# Altium footprint library PcbLib1.PcbLib: 56 footprints (part 3 of 4)
Each footprint in its own frame and in the unit in brackets; x right, y up, seen from the top. Pads: shape width x height; smd on the part's side, far side on the other; paste and mask are expansions set on the pad; w line width, h text height; cw(c..) or ccw(c..) is an arc to the next point about the centre after c.
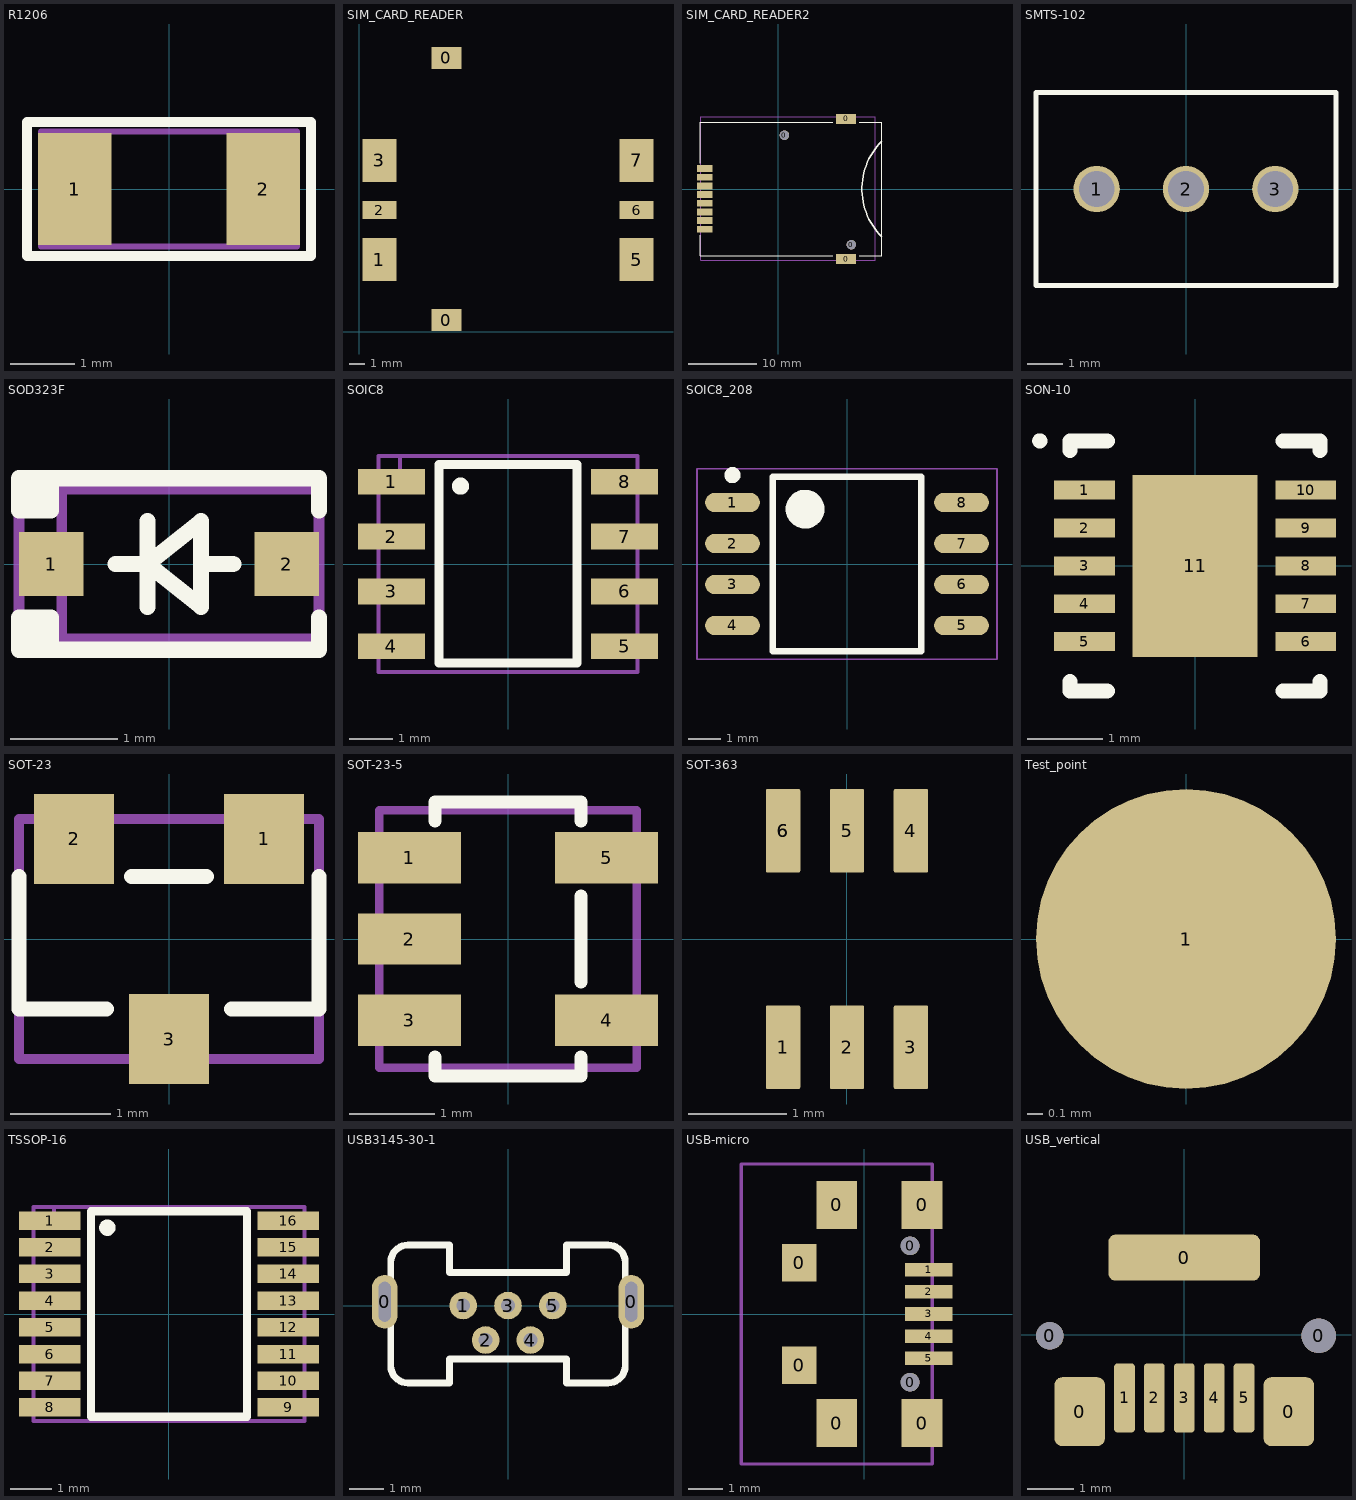
[diagram p2: the footprints below, top view; thin cyan lines are the x and y axes]

## R1206 [mm]
pads (2):
  rect 1.15x1.75 smd: 1(-1.475,0) 2(1.475,0)
Top Overlay:
  lines w0.15: -2.225,-1.05 -2.225,1.05 -1.375,1.05 2.225,1.05 2.225,-1.05 -2.225,-1.05
Mechanical 15:
  lines w0.1: -2,-0.9 2,-0.9 2,0.9 -2,0.9 -2,-0.9
  text ".Designator" at -1.7,-0.1 h0.5
3D body "RES1206-2.step": height 0.55, standoff 0, extent -1.505,-0.775 1.505,0.775

## SIM_CARD_READER [mm]
pads (8):
  rect 1.95x1.45 smd: 0(5.69,0.755) 0(5.69,17.885)
  rect 2.2x2.8 smd: 1(1.31,4.705) 3(1.31,11.185) 5(18.11,4.705) 7(18.11,11.185)
  rect 2.2x1.2 smd: 2(1.31,7.945) 6(18.11,7.945)
3D body "SIM1.stp": height 1.9, standoff -0.1, extent 0.2,0.25 25.72,18.35

## SIM_CARD_READER2 [mm]
pads (12):
  round 1.4 hole 1.4 unplated: 0(0.935,7.885) 0(10.735,-8.165)
  rect 2.95x1.5 smd: 0(9.965,-10.275) 0(9.965,10.275)
  rect 2.3x1 smd: 1(-10.735,2.985) 2(-10.735,1.715) 3(-10.735,0.445) 4(-10.735,-0.825) 5(-10.735,-2.095) 6(-10.735,-3.365) 7(-10.735,-4.635) 8(-10.735,-5.905)
Top Overlay:
  lines w0.15: -11.4,-6.8 -11.4,-9.8 8,-9.8 ; -11.4,3.8 -11.4,9.8 8,9.8 ; 11.9,-9.8 15.2,-9.8 15.2,9.8 11.9,9.8
  lines w0.2: 15.2,-7 cw(c22.2,0) 15.2,7
Mechanical 15:
  lines w0.1: -11.335,-10.415 14.265,-10.415 14.265,10.585 -11.335,10.585 -11.335,-10.415
  text ".Designator" at -0.935,-0.215 h0.5
3D body "SIM2.stp": height 1.94, standoff -0.56, extent -11.335,-10.39 15.165,10.56

## SMTS-102 [mm]
pads (3):
  round 1.3 hole 1 mask+0.07: 1(-2.5,0) 2(0,0) 3(2.5,0)
Top Overlay:
  lines w0.15: -4.2,-2.7 4.2,-2.7 4.2,2.7 -4.2,2.7 -4.2,-2.7
3D body: height 8.4, standoff 1.2, extent -3,-2.7 3,2.7
3D body: height 1.2, standoff -4.8, extent 2.25,-0.4 2.75,0.4
3D body: height 1.2, standoff -4.8, extent -2.75,-0.4 -2.25,0.4
3D body: height 1.2, standoff -4.8, extent -0.25,-0.4 0.25,0.4
3D body: height 22.9, standoff 13.29, extent -1.142,-1.25 4.965,1.25
3D body: height 14.3, standoff 8.3, extent -2.4,-2.4 2.4,2.4
3D body: height 8.3, standoff 1.2, extent -4.1,-2.6 4.1,2.6

## SOD323F [mm]
pads (2):
  rect 0.6x0.6 smd: 1(-1.1,0) 2(1.1,0)
Top Overlay:
  lines w0.15: -1.1,-0.8 -1.1,-0.5 -1.4,-0.5 -1.4,-0.8 1.4,-0.8 1.4,-0.5 ; -1.1,0.8 -1.1,0.5 -1.4,0.5 -1.4,0.8 1.4,0.8 1.4,0.5 ; -0.5,0 -0.2,0 ; -0.2,-0.4 -0.2,0.4 ; 0.3,0 0.6,0 ; -0.2,0 0.3,0.4 0.3,-0.4 -0.2,0 ; -1.3,-0.8 -1.3,-0.5 -1.2,-0.5 -1.2,-0.8 -1.3,-0.8 ; -1.3,0.5 -1.3,0.8 -1.2,0.8 -1.2,0.5 -1.3,0.5
Mechanical 15:
  lines w0.1: -1,-0.7 -1,0.7 ; -1.4,-0.7 1.4,-0.7 1.4,0.7 -1.4,0.7 -1.4,-0.7
  text ".Designator" at -1.7,-0.1 h0.5
3D body "SOD-323F.STEP": height 0.79, standoff -0.08, extent -1.35,-0.675 1.35,0.675

## SOIC8 [mm]
pads (8):
  rect 1.55x0.6 smd: 1(-2.7,1.905) 2(-2.7,0.635) 3(-2.7,-0.635) 4(-2.7,-1.905) 5(2.7,-1.905) 6(2.7,-0.635) 7(2.7,0.635) 8(2.7,1.905)
Top Layer:
  region: -2.7,1.905
Top Overlay:
  circle w0.2: c-1.1,1.805 r0.1
  lines w0.2: -1.6,-2.295 1.6,-2.295 1.6,2.305 -1.6,2.305 -1.6,-2.295
Mechanical 15:
  lines w0.1: -3,2 -2.5,2 -2.5,2.5 ; -3,-2.5 3,-2.5 3,2.5 -3,2.5 -3,-2.5
  text ".Designator" at -2.1,-0.195 h0.5
3D body "SOIC-8-1.step": height 1.75, standoff 0, extent -3,-2.45 3,2.45

## SOIC8_208 [mm]
height 2.16
pads (8):
  oval 1.7x0.6 smd: 1(-3.55,1.905) 2(-3.55,0.635) 3(-3.55,-0.635) 4(-3.55,-1.905) 5(3.55,-1.905) 6(3.55,-0.635) 7(3.55,0.635) 8(3.55,1.905)
Top Overlay:
  circle w0.6: c-1.3,1.7 r0.3
  circle w0.25: c-3.55,2.755 r0.125
  lines w0.2: -2.3,-2.7 2.3,-2.7 2.3,2.7 -2.3,2.7 -2.3,-2.7
Mechanical 15:
  lines w0.05: -4.65,-2.95 4.65,-2.95 4.65,2.95 -4.65,2.95 -4.65,-2.95
3D body "User Library-SOIC-8-208.STEP": height 2.1, standoff -0.05, extent -4.1,-2.7 4.1,2.7

## SON-10 [mm] "SON, 10-Leads, Body 3,00x3,00mm, Pitch 0,50mm, Thermal Pad 2,40x1,65mm, IPC Medium Density"
height 0.75
pads (11):
  rect 0.8x0.25 smd: 1(-1.46,1) 2(-1.46,0.5) 3(-1.46,0) 4(-1.46,-0.5) 5(-1.46,-1) 6(1.46,-1) 7(1.46,-0.5) 8(1.46,0) 9(1.46,0.5) 10(1.46,1)
  rect 1.65x2.4 smd: 11(0,0)
Top Overlay:
  circle w0.1: c-2.05,1.65 r0.05
  lines w0.2: -1.65,-1.525 -1.65,-1.65 -1.16,-1.65 ; -1.65,1.525 -1.65,1.65 -1.16,1.65 ; 1.16,-1.65 1.65,-1.65 1.65,-1.525 ; 1.16,1.65 1.65,1.65 1.65,1.525
3D body "SON10-3x3mm.step": height 0.87, standoff -0.03, extent -1.5,-1.5 1.5,1.5

## SOT-23 [mm]
pads (3):
  rect 0.8x0.9 smd: 1(0.95,1) 2(-0.95,1) 3(0,-1)
Top Overlay:
  lines w0.15: -1.5,0.625 -1.5,-0.7 -0.625,-0.7 ; -0.375,0.625 0.375,0.625 ; 0.625,-0.7 1.5,-0.7 1.5,0.625
Mechanical 15:
  lines w0.1: -1.5,-1.2 -1.5,1.2 1.5,1.2 1.5,-1.2 -1.5,-1.2
  text ".Designator" at -1.75,-0.1 h0.5
3D body "SOT-23.stp": height 0.98, standoff 0, extent -1.46,-1.2 1.46,1.2

## SOT-23-5 [mm]
pads (5):
  rect 1.2x0.6 smd: 1(-1.15,0.95) 2(-1.15,0) 3(-1.15,-0.95) 4(1.15,-0.95) 5(1.15,0.95)
Top Overlay:
  lines w0.15: -0.85,-1.375 -0.85,-1.6 0.85,-1.6 0.85,-1.375 ; -0.85,1.375 -0.85,1.6 0.85,1.6 0.85,1.375 ; 0.85,-0.5 0.85,0.5
Mechanical 15:
  lines w0.1: -1.5,-1.5 -1.5,1.5 1.5,1.5 1.5,-1.5 -1.5,-1.5
  text ".Designator" at -1.7,-0.1 h0.5
3D body "User Library-SOT23-5-1.step": height 1.3, standoff 0, extent -1.5,-1.5 1.5,1.5

## SOT-363 [mm]
pads (7):
  rrect10% 0.35x0.85 smd mask+0.07: 1(-0.65,-1.1) 2(0,-1.1) 3(0.65,-1.1) 4(0.65,1.1) 5(0,1.1) 6(-0.65,1.1) 6(-0.65,1.1)
3D body "SOT-363.stp": height 1, standoff 0, extent -1,-1.1 1,1.1

## Test_point [mm]
pads (1):
  round 2 smd mask+0.07: 1(0,0)

## TSSOP-16 [mm]
pads (16):
  rect 1.5x0.45 smd: 1(-2.9,2.275) 2(-2.9,1.625) 3(-2.9,0.975) 4(-2.9,0.325) 5(-2.9,-0.325) 6(-2.9,-0.975) 7(-2.9,-1.625) 8(-2.9,-2.275) 9(2.9,-2.275) 10(2.9,-1.625) 11(2.9,-0.975) 12(2.9,-0.325) 13(2.9,0.325) 14(2.9,0.975) 15(2.9,1.625) 16(2.9,2.275)
Top Overlay:
  circle w0.2: c-1.5,2.1 r0.1
  lines w0.2: -1.9,-2.5 -1.9,2.5 1.9,2.5 1.9,-2.5 -1.9,-2.5
Mechanical 15:
  lines w0.1: -3.3,2.1 -2.8,2.1 -2.8,2.6 ; -3.3,-2.6 3.3,-2.6 3.3,2.6 -3.3,2.6 -3.3,-2.6
  text ".Designator" at -1.8,-0.125 h0.5
3D body "TSSOP-16.step": height 1.06, standoff -0.01, extent -3.25,-2.55 3.25,2.55

## USB3145-30-1 [mm] "Vertical Micro USB"
pads (7):
  oval 0.75x1.55 hole 0.35 slot 1.15 at 90 deg mask+0.07: 0(-3.575,0.11) 0(3.575,0.11)
  round 0.8 hole 0.4 mask+0.07: 1(-1.3,0) 2(-0.65,-1) 3(0,0) 4(0.65,-1) 5(1.3,0)
Top Overlay:
  lines w0.2: -3.4,-1.745 ccw(c-2.9,-1.745) -2.9,-2.245 -1.7,-2.245 -1.7,-1.545 1.7,-1.545 1.7,-2.245 2.9,-2.245 ccw(c2.9,-1.745) 3.4,-1.745 3.4,1.255 ccw(c2.9,1.255) 2.9,1.755 1.7,1.755 1.7,0.955 -1.7,0.955 -1.7,1.755 -2.9,1.755 ccw(c-2.9,1.255) -3.4,1.255 -3.4,-1.745
3D body "User Library-USB3145-30-0-X_revB.STEP": height 6, standoff -2.3, extent -3.7,-2.245 3.7,1.755

## USB-micro [mm]
pads (13):
  rect 1x1.1 smd: 0(-1.9,-1.5) 0(-1.9,1.5)
  rect 1.2x1.4 smd: 0(-0.8,-3.2) 0(-0.8,3.2) 0(1.7,-3.2) 0(1.7,3.2)
  round 0.55 hole 0.55 unplated paste+0 mask+0: 0(1.35,-2) 0(1.35,2)
  rect 1.4x0.4 smd: 1(1.9,1.3) 2(1.9,0.65) 3(1.9,0) 4(1.9,-0.65) 5(1.9,-1.3)
Mechanical 15:
  lines w0.1: -3.6,-4.4 2,-4.4 2,4.4 -3.6,4.4 -3.6,-4.4
  text ".Designator" at -3,-0.1 h0.5
3D body "MICRO-USB.stp": height 2.83, standoff -0.23, extent -3.6,-4.4 2,4.4

## USB_vertical [mm]
pads (10):
  round 0.6 hole 0.6 unplated: 0(-2.925,-0.025)
  rrect30% 1.1x1.5 smd: 0(-2.275,-1.675) 0(2.275,-1.675)
  rrect30% 3.3x1 smd: 0(0,1.675)
  round 0.75 hole 0.75 unplated: 0(2.925,-0.025)
  rrect30% 0.45x1.5 smd: 1(-1.3,-1.375) 2(-0.65,-1.375) 3(0,-1.375) 4(0.65,-1.375) 5(1.3,-1.375)
3D body "usb_vertical.stp": height 5.25, standoff -0.8, extent -3.7,-1.61 3.7,1.35